# Altium footprint library Dahlia Carrier Board.PcbLib: 99 footprints (part 2 of 7)
Each footprint in its own frame and in the unit in brackets; x right, y up, seen from the top. Pads: shape width x height; smd on the part's side, far side on the other; paste and mask are expansions set on the pad; w line width, h text height; cw(c..) or ccw(c..) is an arc to the next point about the centre after c.
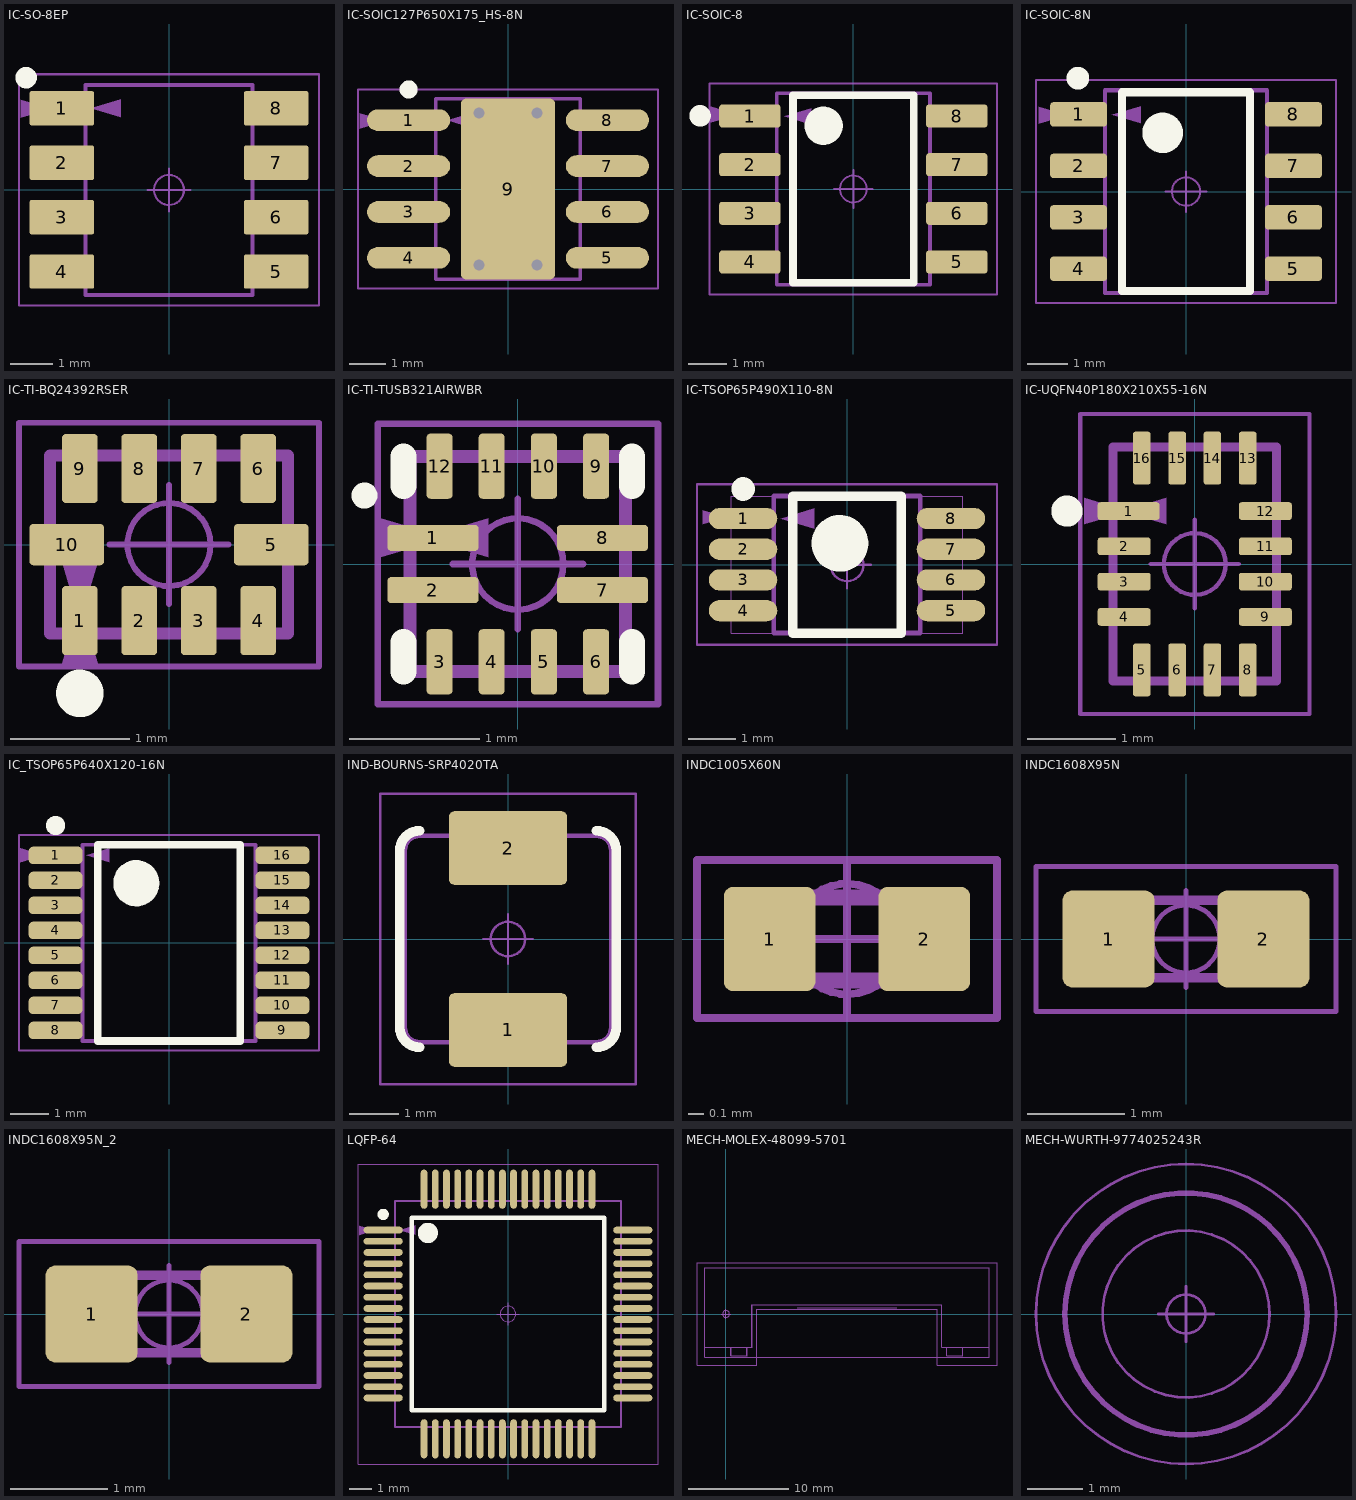
[diagram p1: the footprints below, top view; thin cyan lines are the x and y axes]

## IC-SO-8EP [mm]
pads (8):
  rrect10% 1.5x0.8 smd: 1(-2.5,1.905) 2(-2.5,0.635) 3(-2.5,-0.635) 4(-2.5,-1.905) 5(2.5,-1.905) 6(2.5,-0.635) 7(2.5,0.635) 8(2.5,1.905)
Top Overlay:
  circle w0.25: c-3.334,2.619 r0.125
Top Component Outline:
  region: -3.455,1.681 -2.745,1.893 -3.455,2.107
  lines w0.05: -3.5,-2.7 3.5,-2.7 3.5,2.7 -3.5,2.7 -3.5,-2.7
Top 3D Body:
  lines w0.001: -1.95,-2.45 -1.95,2.45 1.95,2.45 1.95,-2.45 -1.95,-2.45
Top Dimensions:
  region: -1.12,2.119 -1.83,1.907 -1.12,1.693
  lines w0.1: -1.95,-2.45 -1.95,2.45 1.95,2.45 1.95,-2.45 -1.95,-2.45
Top Component Center:
  circle w0.05: c0,0 r0.35
  lines w0.05: -0.5,0 0.5,0 ; 0,-0.5 0,0.5
Top Assembly:
  text ".Designator" at 0.691,0.169 h0.75
3D body "test2.step": height 1.63, standoff 0, extent -3,-2.5 3,2.5

## IC-SOIC127P650X175_HS-8N [mm]
height 5.5
pads (9):
  oval 2.3x0.6 smd: 1(-2.75,1.905) 2(-2.75,0.635) 3(-2.75,-0.635) 4(-2.75,-1.905) 5(2.75,-1.905) 6(2.75,-0.635) 7(2.75,0.635) 8(2.75,1.905)
  rrect10% 2.6x5 smd paste-5 mask-5: 9(0,0)
via 0.8,-2.1 diameter 0.6 hole 0.3
via -0.8,-2.1 diameter 0.6 hole 0.3
via 0.8,2.1 diameter 0.6 hole 0.3
via -0.8,2.1 diameter 0.6 hole 0.3
Top Overlay:
  circle w0.25: c-2.75,2.755 r0.125
Top Paste:
  rectangle: -1.049,-1.5 1.051,1.5
Top Solder:
  rectangle: -1.3,-1.7 1.3,1.7
Top Component Outline:
  region: -4.105,1.669 -3.395,1.881 -4.105,2.095
  lines w0.05: -4.15,-2.75 4.15,-2.75 4.15,2.75 -4.15,2.75 -4.15,-2.75
Top 3D Body:
  lines w0.01: -2,-2.5 2,-2.5 2,2.5 -2,2.5 -2,-2.5
Top Dimensions:
  region: -0.975,2.113 -1.685,1.9 -0.975,1.687
  lines w0.1: -2,-2.5 -2,2.5 2,2.5 2,-2.5 -2,-2.5
Top Component Center:
  circle w0.05: c0,0 r0.35
  lines w0.05: -0.5,0 0.5,0 ; 0,-0.5 0,0.5
Top Assembly:
  text ".Designator" at -1.778,2.972 h0.75
3D body "test-8.step": height 1.75, standoff 0, extent -3,-2.5 3,2.5

## IC-SOIC-8 [mm] "SOIC-8, 8-Leads, Body 6.19mmx5.00mm, Pitch 1.27mm, IPC Medium Density"
height 1.75
pads (8):
  rrect25% 1.6x0.6 smd: 1(-2.7,1.905) 2(-2.7,0.635) 3(-2.7,-0.635) 4(-2.7,-1.905) 5(2.7,-1.905) 6(2.7,-0.635) 7(2.7,0.635) 8(2.7,1.905)
Top Overlay:
  circle w0.4: c-4,1.91 r0.08
  circle w0.5: c-0.775,1.65 r0.25
  lines w0.2: -1.575,-2.45 1.575,-2.45 1.575,2.45 -1.575,2.45 -1.575,-2.45
Top Component Outline:
  region: -3.73,1.731 -3.02,1.943 -3.73,2.157
  lines w0.05: -3.75,-2.75 3.75,-2.75 3.75,2.75 -3.75,2.75 -3.75,-2.75
Top 3D Body:
  lines w0.001: -2,-2.5 2,-2.5 2,2.5 -2,2.5 -2,-2.5
Top Dimensions:
  region: -1.095,2.106 -1.805,1.894 -1.095,1.68
  lines w0.1: -2,-2.5 2,-2.5 2,2.5 -2,2.5 -2,-2.5
Top Component Center:
  circle w0.05: c0,0 r0.35
  lines w0.05: -0.5,0 0.5,0 ; 0,-0.5 0,0.5
Top Assembly:
  text ".Designator" at 0.475,0.225 h0.75
3D body "test2.step": height 1.63, standoff 0, extent -3,-2.5 3,2.5

## IC-SOIC-8N [mm]
pads (8):
  rrect25% 1.4x0.6 smd: 1(-2.65,1.905) 2(-2.65,0.635) 3(-2.65,-0.635) 4(-2.65,-1.905) 5(2.65,-1.905) 6(2.65,-0.635) 7(2.65,0.635) 8(2.65,1.905)
Top Overlay:
  circle w0.5: c-0.575,1.45 r0.25
  circle w0.4: c-2.667,2.797 r0.08
  lines w0.2: -1.575,-2.45 -1.575,2.45 1.575,2.45 1.575,-2.45 -1.575,-2.45
Top Component Outline:
  region: -3.63,1.669 -2.92,1.881 -3.63,2.095
  lines w0.05: -3.7,-2.75 -3.7,2.75 3.7,2.75 3.7,-2.75 -3.7,-2.75
Top 3D Body:
  lines w0.001: -2,-2.5 -2,2.5 2,2.5 2,-2.5 -2,-2.5
Top Dimensions:
  region: -1.12,2.106 -1.83,1.894 -1.12,1.68
  lines w0.1: -2,-2.5 -2,2.5 2,2.5 2,-2.5 -2,-2.5
Top Component Center:
  circle w0.05: c0,0 r0.35
  lines w0.05: -0.5,0 0.5,0 ; 0,-0.5 0,0.5
Top Assembly:
  text ".Designator" at -1.803,3.023 h0.75
3D body "User Library-SOIC127P500X620X175-8.STEP": height 1.75, standoff 0, extent -3.115,-2.5 3.115,2.5

## IC-TI-BQ24392RSER [mm] "USB High Speed Switch"
height 0.6
pads (10):
  rrect20% 0.3x0.58 smd: 1(-0.75,-0.64) 2(-0.25,-0.64) 3(0.25,-0.64) 4(0.75,-0.64) 6(0.75,0.64) 7(0.25,0.64) 8(-0.25,0.64) 9(-0.75,0.64)
  rrect20% 0.63x0.35 smd: 5(0.86,0) 10(-0.86,0)
Top Overlay:
  circle w0.2: c-0.75,-1.252 r0.1
Top Component Outline:
  region: -0.6,-1 -0.75,-0.5 -0.9,-1
  lines w0.05: -1.262,-1.025 1.262,-1.025 1.262,1.025 -1.262,1.025 -1.262,-1.025
Top 3D Body:
  lines w0.01: -1,-0.75 -1,0.75 1,0.75 1,-0.75 -1,-0.75
Top Dimensions:
  region: -0.9,-0.15 -0.75,-0.65 -0.6,-0.15
  lines w0.1: -1,-0.75 1,-0.75 1,0.75 -1,0.75 -1,-0.75
Top Component Center:
  circle w0.05: c0,0 r0.35
  lines w0.05: -0.5,0 0.5,0 ; 0,-0.5 0,0.5
Top Assembly:
  text ".Designator" at -1.716,-0.2 h0.75
3D body "Testz.step": height 0.6, standoff 0, extent -1.026,-0.776 1.026,0.776

## IC-TI-TUSB321AIRWBR [mm]
height 0.4
pads (12):
  rrect30% 0.7x0.2 smd: 1(-0.65,0.2) 2(-0.65,-0.2) 7(0.65,-0.2) 8(0.65,0.2)
  rrect30% 0.2x0.5 smd: 3(-0.6,-0.75) 4(-0.2,-0.75) 5(0.2,-0.75) 6(0.6,-0.75) 9(0.6,0.75) 10(0.2,0.75) 11(-0.2,0.75) 12(-0.6,0.75)
Top Overlay:
  circle w0.1: c-1.175,0.525 r0.05
  lines w0.2: -0.875,-0.825 -0.875,-0.6 ; -0.875,0.6 -0.875,0.825 ; 0.875,-0.825 0.875,-0.6 ; 0.875,0.6 0.875,0.825
Top Component Outline:
  region: -1.05,0.05 -0.55,0.2 -1.05,0.35
  lines w0.05: -1.075,-1.075 -1.075,1.075 1.075,1.075 1.075,-1.075 -1.075,-1.075
Top 3D Body:
  lines w0.001: -0.825,-0.825 -0.825,0.825 0.825,0.825 0.825,-0.825 -0.825,-0.825
Top Dimensions:
  region: -0.225,0.35 -0.725,0.2 -0.225,0.05
  lines w0.1: -0.825,-0.825 -0.825,0.825 0.825,0.825 0.825,-0.825 -0.825,-0.825
Top Component Center:
  circle w0.05: c0,0 r0.35
  lines w0.05: -0.5,0 0.5,0 ; 0,-0.5 0,0.5
Top Assembly:
  text ".Designator" at -0.7,-0.2 h0.75
3D body "IC-TI-TUSB321AIRWBR.step": height 0.4, standoff 0, extent -0.825,-0.825 0.825,0.825

## IC-TSOP65P490X110-8N [mm] "TSOP, 8-Leads, Body 3.00x3.00mm, Pitch 0.65mm, IPC Medium Density"
height 1.1
pads (8):
  oval 1.45x0.45 smd: 1(-2.2,0.975) 2(-2.2,0.325) 3(-2.2,-0.325) 4(-2.2,-0.975) 5(2.2,-0.975) 6(2.2,-0.325) 7(2.2,0.325) 8(2.2,0.975)
Top Overlay:
  circle w0.25: c-2.2,1.6 r0.125
  circle w0.6: c-0.15,0.45 r0.3
  lines w0.2: -1.15,-1.45 -1.15,1.45 1.15,1.45 1.15,-1.45 -1.15,-1.45
Top Component Outline:
  region: -3.05,0.85 -2.55,1 -3.05,1.15
  lines w0.05: -3.175,-1.7 -3.175,1.7 3.175,1.7 3.175,-1.7 -3.175,-1.7
Top 3D Body:
  lines w0.001: -2.45,-1.45 -2.45,1.45 2.45,1.45 2.45,-1.45 -2.45,-1.45
Top Dimensions:
  region: -0.69,1.188 -1.4,0.975 -0.69,0.762
  lines w0.1: -1.55,-1.45 1.55,-1.45 1.55,1.45 -1.55,1.45 -1.55,-1.45
Top Component Center:
  circle w0.05: c0,0 r0.35
  lines w0.05: -0.5,0 0.5,0 ; 0,-0.5 0,0.5
Top Assembly:
  text ".Designator" at -1.69,-0.17 h0.75
3D body "TSOP65P490X110-8N.step": height 1.1, standoff 0, extent -2.45,-1.45 2.45,1.45

## IC-UQFN40P180X210X55-16N [mm]
height 5.5
pads (16):
  rrect30% 0.7x0.2 smd: 1(-0.75,0.6)
  rrect30% 0.6x0.2 smd: 2(-0.8,0.2) 3(-0.8,-0.2) 4(-0.8,-0.6) 9(0.8,-0.6) 10(0.8,-0.2) 11(0.8,0.2) 12(0.8,0.6)
  rrect30% 0.2x0.6 smd: 5(-0.6,-1.2) 6(-0.2,-1.2) 7(0.2,-1.2) 8(0.6,-1.2) 13(0.6,1.2) 14(0.2,1.2) 15(-0.2,1.2) 16(-0.6,1.2)
Top Overlay:
  circle w0.254: c-1.449,0.6 r0.05
Top Component Outline:
  region: -1.25,0.45 -0.75,0.6 -1.25,0.75
  lines w0.05: -1.3,-1.7 -1.3,1.7 1.3,1.7 1.3,-1.7 -1.3,-1.7
Top 3D Body:
  lines w0.001: -0.926,-1.326 -0.926,1.326 0.926,1.326 0.926,-1.326 -0.926,-1.326
Top Dimensions:
  region: -0.325,0.75 -0.825,0.6 -0.325,0.45
  lines w0.1: -0.925,-1.325 -0.925,1.325 0.925,1.325 0.925,-1.325 -0.925,-1.325
Top Component Center:
  circle w0.05: c0,0 r0.35
  lines w0.05: -0.5,0 0.5,0 ; 0,-0.5 0,0.5
Top Assembly:
  text ".Designator" at 0.2,-0.7 h0.75
3D body "test13.step": height 0.55, standoff 0, extent -0.926,-1.326 0.926,1.326

## IC_TSOP65P640X120-16N [mm]
height 5.5
pads (16):
  rrect50% 1.4x0.45 smd: 1(-2.95,2.275) 2(-2.95,1.625) 3(-2.95,0.975) 4(-2.95,0.325) 5(-2.95,-0.325) 6(-2.95,-0.975) 7(-2.95,-1.625) 8(-2.95,-2.275) 9(2.95,-2.275) 10(2.95,-1.625) 11(2.95,-0.975) 12(2.95,-0.325) 13(2.95,0.325) 14(2.95,0.975) 15(2.95,1.625) 16(2.95,2.275)
Top Overlay:
  circle w0.25: c-2.95,3.05 r0.125
  circle w0.6: c-0.85,1.55 r0.3
  lines w0.2: -1.85,-2.55 1.85,-2.55 1.85,2.55 -1.85,2.55 -1.85,-2.55
Top Component Outline:
  region: -3.9,2.08 -3.25,2.275 -3.9,2.47
  lines w0.05: -3.9,-2.8 3.9,-2.8 3.9,2.8 -3.9,2.8 -3.9,-2.8
Top 3D Body:
  lines w0.001: -2.25,-2.55 -2.25,2.55 2.25,2.55 2.25,-2.55 -2.25,-2.55
Top Dimensions:
  region: -1.55,2.455 -2.15,2.275 -1.55,2.095
  lines w0.1: -2.25,-2.55 2.25,-2.55 2.25,2.55 -2.25,2.55 -2.25,-2.55
Top Assembly:
  text ".Designator" at -0.9,-0.4 h0.75
3D body "test-1.step": height 1.2, standoff 0, extent -3.2,-2.55 3.2,2.55

## IND-BOURNS-SRP4020TA [mm]
pads (2):
  rrect15% 2.4x1.5 smd: 1(0,-1.85) 2(0,1.85)
Top Overlay:
  lines w0.2: -1.8,-2.2 cw(c-1.8,-1.8) -2.2,-1.8 -2.2,1.8 cw(c-1.8,1.8) -1.8,2.2 ; 1.8,-2.2 ccw(c1.8,-1.8) 2.2,-1.8 2.2,1.8 ccw(c1.8,1.8) 1.8,2.2
Top Component Outline:
  lines w0.05: -2.6,-2.95 -2.6,2.95 2.6,2.95 2.6,-2.95 -2.6,-2.95
Top 3D Body:
  lines w0.001: -2.1,-1.8 ccw(c-1.8,-1.8) -1.8,-2.1 1.8,-2.1 ccw(c1.8,-1.8) 2.1,-1.8 2.1,1.8 ccw(c1.8,1.8) 1.8,2.1 -1.8,2.1 ccw(c-1.8,1.8) -2.1,1.8 -2.1,-1.8
Top Dimensions:
  lines w0.1: -2.1,-1.8 ccw(c-1.8,-1.8) -1.8,-2.1 1.8,-2.1 ccw(c1.8,-1.8) 2.1,-1.8 2.1,1.8 ccw(c1.8,1.8) 1.8,2.1 -1.8,2.1 ccw(c-1.8,1.8) -2.1,1.8 -2.1,-1.8
Top Component Center:
  circle w0.05: c0,0 r0.35
  lines w0.05: -0.5,0 0.5,0 ; 0,-0.5 0,0.5
Top Assembly:
  text ".Designator" at 0.225,-0.475 h0.75
3D body "SRP4020TA series.stp": height 1.92, standoff 0.01, extent -2.1,-2.2 2.1,2.2

## INDC1005X60N [mm]
height 5.5
pads (2):
  rrect20% 0.58x0.66 smd: 1(-0.49,0) 2(0.49,0)
Top Component Outline:
  lines w0.05: -0.95,-0.5 0.95,-0.5 0.95,0.5 -0.95,0.5 -0.95,-0.5
Top 3D Body:
  lines w0.001: -0.5,-0.25 0.5,-0.25 0.5,0.25 -0.5,0.25 -0.5,-0.25
Top Dimensions:
  lines w0.1: -0.512,-0.262 0.512,-0.262 0.512,0.262 -0.512,0.262 -0.512,-0.262
Top Component Center:
  circle w0.05: c0,0 r0.35
  lines w0.05: -0.5,0 0.5,0 ; 0,-0.5 0,0.5
Top Assembly:
  text ".Designator" at -0.925,0.775 h0.75
3D body "User Library-FB_1005.STEP": height 0.5, standoff 0, extent -0.5,-0.25 0.5,0.25

## INDC1608X95N [mm]
height 5.5
pads (2):
  rrect20% 0.95x1 smd: 1(-0.8,0) 2(0.8,0)
Top Component Outline:
  lines w0.05: -1.55,-0.75 1.55,-0.75 1.55,0.75 -1.55,0.75 -1.55,-0.75
Top 3D Body:
  lines w0.001: -0.8,-0.4 0.8,-0.4 0.8,0.4 -0.8,0.4 -0.8,-0.4
Top Dimensions:
  lines w0.1: -0.8,-0.4 0.8,-0.4 0.8,0.4 -0.8,0.4 -0.8,-0.4
Top Component Center:
  circle w0.05: c0,0 r0.35
  lines w0.05: -0.5,0 0.5,0 ; 0,-0.5 0,0.5
Top Assembly:
  text ".Designator" at -1.25,1.025 h0.75
3D body "User Library-FB_1608-1.STEP": height 0.8, standoff 0, extent -0.8,-0.4 0.8,0.4

## INDC1608X95N_2 [mm]
pads (2):
  rrect20% 0.95x1 smd: 1(-0.8,0) 2(0.8,0)
Top Component Outline:
  lines w0.05: -1.55,-0.75 -1.55,0.75 1.55,0.75 1.55,-0.75 -1.55,-0.75
Top 3D Body:
  lines w0.001: -0.8,-0.4 -0.8,0.4 0.8,0.4 0.8,-0.4 -0.8,-0.4
Top Dimensions:
  lines w0.1: -0.8,-0.4 -0.8,0.4 0.8,0.4 0.8,-0.4 -0.8,-0.4
Top Component Center:
  circle w0.05: c0,0 r0.35
  lines w0.05: -0.5,0 0.5,0 ; 0,-0.5 0,0.5
Top Assembly:
  text ".Designator" at -1.25,1.025 h0.75
3D body "User Library-FB_1608-1.STEP": height 0.8, standoff 0, extent -0.8,-0.4 0.8,0.4

## LQFP-64 [mm]
pads (64):
  oval 1.75x0.3 smd: 1(-5.575,3.75) 2(-5.575,3.25) 3(-5.575,2.75) 4(-5.575,2.25) 5(-5.575,1.75) 6(-5.575,1.25) 7(-5.575,0.75) 8(-5.575,0.25) 9(-5.575,-0.25) 10(-5.575,-0.75) 11(-5.575,-1.25) 12(-5.575,-1.75) 13(-5.575,-2.25) 14(-5.575,-2.75) 15(-5.575,-3.25) 16(-5.575,-3.75) 33(5.575,-3.75) 34(5.575,-3.25) 35(5.575,-2.75) 36(5.575,-2.25) 37(5.575,-1.75) 38(5.575,-1.25) 39(5.575,-0.75) 40(5.575,-0.25) 41(5.575,0.25) 42(5.575,0.75) 43(5.575,1.25) 44(5.575,1.75) 45(5.575,2.25) 46(5.575,2.75) 47(5.575,3.25) 48(5.575,3.75)
  oval 0.3x1.75 smd: 17(-3.75,-5.575) 18(-3.25,-5.575) 19(-2.75,-5.575) 20(-2.25,-5.575) 21(-1.75,-5.575) 22(-1.25,-5.575) 23(-0.75,-5.575) 24(-0.25,-5.575) 25(0.25,-5.575) 26(0.75,-5.575) 27(1.25,-5.575) 28(1.75,-5.575) 29(2.25,-5.575) 30(2.75,-5.575) 31(3.25,-5.575) 32(3.75,-5.575) 49(3.75,5.575) 50(3.25,5.575) 51(2.75,5.575) 52(2.25,5.575) 53(1.75,5.575) 54(1.25,5.575) 55(0.75,5.575) 56(0.25,5.575) 57(-0.25,5.575) 58(-0.75,5.575) 59(-1.25,5.575) 60(-1.75,5.575) 61(-2.25,5.575) 62(-2.75,5.575) 63(-3.25,5.575) 64(-3.75,5.575)
Top Overlay:
  circle w0.6: c-3.58,3.62 r0.15
  circle w0.25: c-5.575,4.45 r0.125
  lines w0.2: -4.3,-4.3 4.3,-4.3 4.3,4.3 -4.3,4.3 -4.3,-4.3
Top Component Outline:
  region: -6.655,3.519 -5.945,3.731 -6.655,3.945
  lines w0.05: -6.7,-6.7 -6.7,6.7 6.7,6.7 6.7,-6.7 -6.7,-6.7
Top 3D Body:
  lines w0.01: -5.05,-5.05 -5.05,5.05 5.05,5.05 5.05,-5.05 -5.05,-5.05
Top Dimensions:
  region: -4.145,3.956 -4.855,3.744 -4.145,3.531
  lines w0.1: -5.05,-5.05 5.05,-5.05 5.05,5.05 -5.05,5.05 -5.05,-5.05
Top Component Center:
  circle w0.05: c0,0 r0.35
  lines w0.05: -0.5,0 0.5,0 ; 0,-0.5 0,0.5
Top Assembly:
  text ".Designator" at -0.5,-0.275 h0.75
3D body "test-12.step": height 1.6, standoff 0, extent -6,-6 6,6

## MECH-MOLEX-48099-5701 [mm]
Top Component Outline:
  lines w0.05: -2.9,-5.15 -2.9,5.15 27.1,5.15 27.1,-5.15 21.15,-5.15 21.15,0.5 3.05,0.5 3.05,-5.15 -2.9,-5.15
Top 3D Body:
  lines w0.001: 0.5,-3.35 0.5,-4.16 2.1,-4.16 2.1,-3.35 ; 7.1,0.6 17.1,0.6 ; 22.1,-3.35 22.1,-4.16 23.7,-4.16 23.7,-3.35 ; -2.125,-3.35 2.6,-3.35 2.6,0.93 21.6,0.93 21.6,-3.35 26.325,-3.35 ; -2.125,-3.35 -2.125,4.6 26.325,4.6 26.325,-3.35 ; -2.125,-3.35 -2.125,-4.31 26.325,-4.31 26.325,-3.35
Top Dimensions:
  lines w0.1: 0.5,-3.35 0.5,-4.16 2.1,-4.16 2.1,-3.35 ; 22.1,-3.35 22.1,-4.16 23.7,-4.16 23.7,-3.35 ; -2.125,-3.35 2.6,-3.35 2.6,0.93 21.6,0.93 21.6,-3.35 26.325,-3.35 26.325,4.6 -2.125,4.6 -2.125,-3.35
Top Component Center:
  circle w0.05: c0,0 r0.35
  lines w0.05: -0.5,0 0.5,0 ; 0,-0.5 0,0.5
Top Assembly:
  text ".Designator" at 10.236,-5.029 h0.75
3D body "Mech (1).STEP": height 6.56, standoff -0.73, extent -2.125,-4.31 26.325,4.6

## MECH-WURTH-9774025243R [mm]
Top Component Outline:
  circle w0.05: c0,0 r1.499
  circle w0.05: c0,0 r2.693
Top 3D Body:
  circle w0.001: c0,0 r2.175
Top Dimensions:
  circle w0.1: c0,0 r2.175
Top Component Center:
  circle w0.05: c0,0 r0.35
  lines w0.05: -0.5,0 0.5,0 ; 0,-0.5 0,0.5
Top Assembly:
  text ".Designator" at -1.321,-0.152 h0.75
3D body "9774025243R (rev1).stp": height 2.51, standoff -1.39, extent -2.175,-2.172 2.175,2.172